# Altium footprint library devices.PCBLIB: 335 footprints (part 17 of 21)
Each footprint in its own frame and in the unit in brackets; x right, y up, seen from the top. Pads: shape width x height; smd on the part's side, far side on the other; paste and mask are expansions set on the pad; w line width, h text height; cw(c..) or ccw(c..) is an arc to the next point about the centre after c.
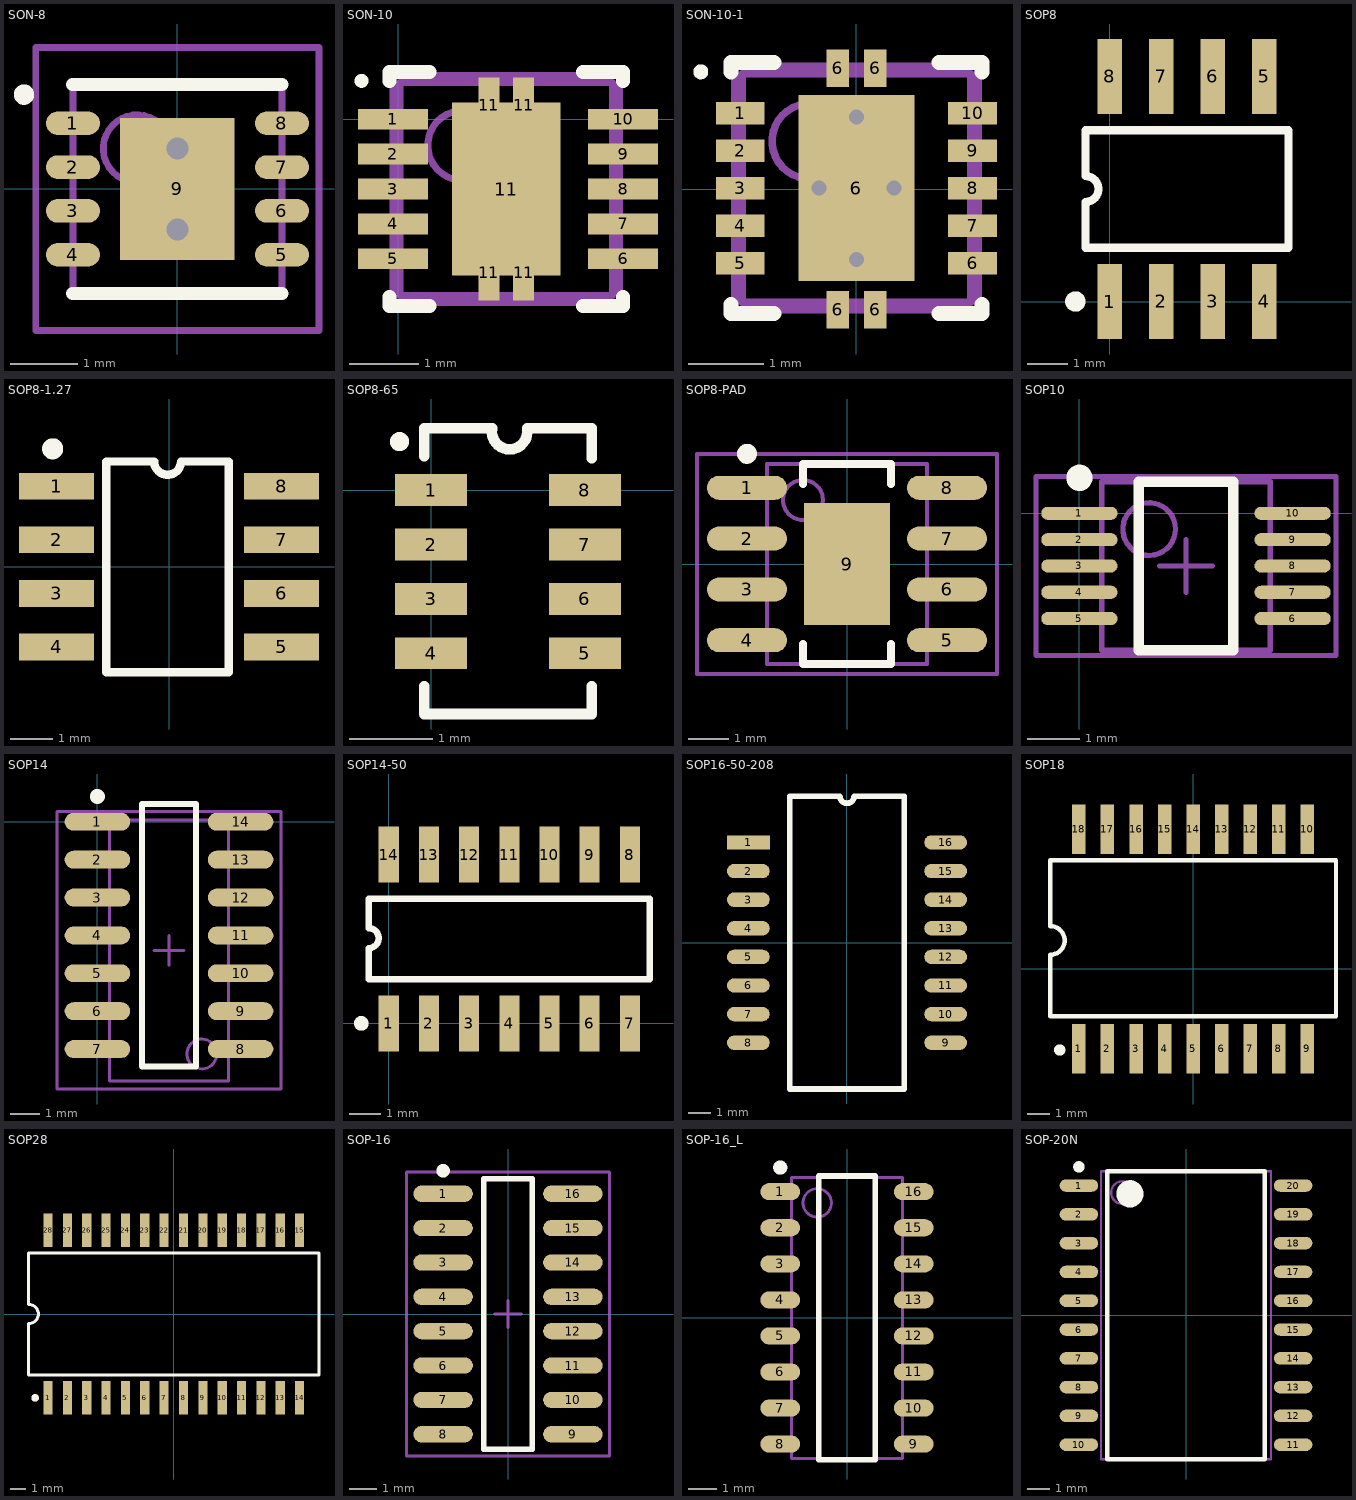
[diagram p16: the footprints below, top view; thin cyan lines are the x and y axes]

## SON-8 [mm] "SON, 8-Leads, Body 3x3 mm, Pitch 0.65mm, IPC Medium Density"
height 0.8
pads (9):
  oval 0.8x0.35 smd: 1(-1.55,0.975) 2(-1.55,0.325) 3(-1.55,-0.325) 4(-1.55,-0.975) 5(1.55,-0.975) 6(1.55,-0.325) 7(1.55,0.325) 8(1.55,0.975)
  rect 1.7x2.1 smd: 9(0,0)
via 0,0.6 diameter 0.66 hole 0.33
via 0,-0.6 diameter 0.66 hole 0.33
Top Overlay:
  circle w0.152: c-2.275,1.4 r0.075
  lines w0.2: -1.55,-1.55 1.55,-1.55 ; -1.55,1.55 1.55,1.55
Mechanical 13:
  circle w0.1: c-0.6,0.6 r0.5
  lines w0.1: -1.55,-1.55 -1.55,1.55 1.55,1.55 1.55,-1.55 -1.55,-1.55
Mechanical 15:
  lines w0.1: -0.5,0 0.5,0 ; 0,-0.5 0,0.5 ; -2.1,-2.1 -2.1,2.1 2.1,2.1 2.1,-2.1 -2.1,-2.1
3D body: height 0.8, standoff 0, extent -1.55,-1.55 1.55,1.55

## SON-10 [mm]
pads (15):
  rect 1x0.3 smd: 1(-0.075,0) 2(-0.075,-0.5) 3(-0.075,-1) 4(-0.075,-1.5) 5(-0.075,-2) 6(3.225,-2) 7(3.225,-1.5) 8(3.225,-1) 9(3.225,-0.5) 10(3.225,0)
  rect 0.3x0.8 smd: 11(1.3,-2.2) 11(1.3,0.2) 11(1.8,-2.2) 11(1.8,0.2)
  rect 1.55x2.48 smd: 11(1.55,-1)
Top Overlay:
  circle w0.1: c-0.525,0.55 r0.05
  lines w0.2: -0.125,-2.55 -0.125,-2.675 0.45,-2.675 ; -0.125,0.55 -0.125,0.675 0.45,0.675 ; 2.65,-2.675 3.225,-2.675 3.225,-2.55 ; 2.65,0.675 3.225,0.675 3.225,0.55
Mechanical 13:
  circle w0.1: c0.925,-0.375 r0.5
  lines w0.1: 0.025,-2.525 0.025,0.525 3.075,0.525 3.075,-2.525 0.025,-2.525
Mechanical 15:
  lines w0.1: 1.05,-1 2.05,-1 ; 1.55,-1.5 1.55,-0.5 ; -0.075,-2.625 3.175,-2.625 3.175,0.625 -0.075,0.625 -0.075,-2.625
3D body: height 1, standoff 0, extent 0.026,-2.524 3.074,0.524

## SON-10-1 [mm]
pads (15):
  rect 0.65x0.3 smd: 1(-1.55,1.013) 2(-1.55,0.513) 3(-1.55,0.013) 4(-1.55,-0.487) 5(-1.55,-0.987) 6(1.55,-0.987) 7(1.55,-0.487) 8(1.55,0.013) 9(1.55,0.513) 10(1.55,1.013)
  rect 0.3x0.5 smd: 6(-0.25,-1.612) 6(-0.25,1.613) 6(0.25,-1.612) 6(0.25,1.613)
  rect 1.55x2.48 smd: 6(0,0.013)
via 0,-0.937 diameter 0.5 hole 0.2
via 0,0.963 diameter 0.5 hole 0.2
via 0.5,0.013 diameter 0.5 hole 0.2
via -0.5,0.013 diameter 0.5 hole 0.2
Top Overlay:
  circle w0.1: c-2.075,1.563 r0.05
  lines w0.2: -1.675,-1.537 -1.675,-1.662 -1.1,-1.662 ; -1.675,1.563 -1.675,1.688 -1.1,1.688 ; 1.1,-1.662 1.675,-1.662 1.675,-1.537 ; 1.1,1.688 1.675,1.688 1.675,1.563
Mechanical 13:
  circle w0.1: c-0.625,0.638 r0.5
  lines w0.1: -1.525,-1.512 1.525,-1.512 1.525,1.538 -1.525,1.538 -1.525,-1.512
Mechanical 15:
  lines w0.1: -0.5,0.013 0.5,0.013 ; 0,-0.487 0,0.513 ; -1.625,-1.612 -1.625,1.638 1.625,1.638 1.625,-1.612 -1.625,-1.612
3D body: height 1, standoff 0, extent -1.524,-1.512 1.524,1.537

## SOP8 [mm] "Small Outline; 8 Leads; Body Width 3.9 mm; Pitch 1.27 mm"
height 1.75
pads (8):
  rect 0.6x1.85 smd: 1(0,0) 2(1.27,0) 3(2.54,0) 4(3.81,0) 5(3.81,5.55) 6(2.54,5.55) 7(1.27,5.55) 8(0,5.55)
Top Overlay:
  circle w0.25: c-0.85,0 r0.125
  lines w0.2: -0.595,1.325 4.405,1.325 4.405,4.225 -0.595,4.225 -0.595,3.093 cw(c-0.595,2.775) -0.595,2.458 -0.595,1.325

## SOP8-1.27 [mil]
pads (8):
  rect 70x25 smd: 1(-105,75) 2(-105,25) 3(-105,-25) 4(-105,-75) 5(105,-75) 6(105,-25) 7(105,25) 8(105,75)
Top Overlay:
  circle w9.84: c-108.58,109.92 r4.92
  lines w7.87: -58.39,-98.74 -58.39,98.11 -13.8,98.11 ccw(c-1.3,98.11) 11.2,98.11 55.79,98.11 55.79,-98.74 -58.39,-98.74

## SOP8-65 [mil]
pads (8):
  rect 34x15 smd: 1(0,0) 2(0,-25.59) 3(0,-51.19) 4(0,-76.78) 5(72.44,-76.78) 6(72.44,-51.19) 7(72.44,-25.59) 8(72.44,0)
Top Overlay:
  circle w7: c-14.86,22.85 r0.98
  lines w5: -3.28,-92.39 -3.28,-105.39 75.72,-105.39 75.72,-92.39 ; -3.28,16.11 -3.28,29.11 28.72,29.11 ; 28.72,28.61 ccw(c36.97,27.54) 45.22,28.61 ; 45.22,29.11 75.72,29.11 75.72,15.11

## SOP8-PAD [mm] "8-Pin Small Outline Integrated Circuit 1.27 mm Pitch, IPC Medium Density"
height 1.55
pads (9):
  oval 2x0.6 smd: 1(-2.5,1.905) 2(-2.5,0.635) 3(-2.5,-0.635) 4(-2.5,-1.905) 5(2.5,-1.905) 6(2.5,-0.635) 7(2.5,0.635) 8(2.5,1.905)
  rect 2.15x3.05 smd: 9(0,0)
Top Overlay:
  circle w0.25: c-2.5,2.755 r0.125
  lines w0.2: -1.1,-2 -1.1,-2.5 1.1,-2.5 1.1,-2 ; -1.1,2 -1.1,2.5 1.1,2.5 1.1,2
Mechanical 13:
  circle w0.1: c-1.1,1.6 r0.5
  lines w0.1: -2,-2.5 -2,2.5 2,2.5 2,-2.5 -2,-2.5
Mechanical 15:
  lines w0.1: -0.5,0 0.5,0 ; 0,-0.5 0,0.5 ; -3.75,-2.75 -3.75,2.75 3.75,2.75 3.75,-2.75 -3.75,-2.75
3D body: height 1.55, standoff 0, extent -2,-2.5 2,2.5

## SOP10 [mm]
pads (10):
  oval 1.45x0.25 smd: 1(0,0) 2(0,-0.5) 3(0,-1) 4(0,-1.5) 5(0,-2) 6(4.05,-2) 7(4.05,-1.5) 8(4.05,-1) 9(4.05,-0.5) 10(4.05,0)
Top Overlay:
  circle w0.25: c0,0.675 r0.125
  lines w0.2: 1.125,-2.6 1.125,0.6 2.925,0.6 2.925,-2.6 1.125,-2.6
Mechanical 13:
  circle w0.1: c1.325,-0.3 r0.5
  lines w0.1: 0.425,-2.6 0.425,0.6 3.625,0.6 3.625,-2.6 0.425,-2.6
Mechanical 15:
  lines w0.1: 1.525,-1 2.525,-1 ; 2.025,-1.5 2.025,-0.5 ; -0.825,-2.7 -0.825,0.7 4.875,0.7 4.875,-2.7 -0.825,-2.7
3D body: height 1.09, standoff 0, extent 0.425,-2.6 3.625,0.6

## SOP14 [mm]
pads (14):
  oval 2.2x0.6 smd: 1(0,0) 2(0,-1.27) 3(0,-2.54) 4(0,-3.81) 5(0,-5.08) 6(0,-6.35) 7(0,-7.62) 8(4.8,-7.62) 9(4.8,-6.35) 10(4.8,-5.08) 11(4.8,-3.81) 12(4.8,-2.54) 13(4.8,-1.27) 14(4.8,0)
Top Overlay:
  circle w0.25: c0,0.85 r0.125
  lines w0.2: 1.5,-8.21 1.5,0.59 3.3,0.59 3.3,-8.21 1.5,-8.21
Mechanical 13:
  circle w0.1: c3.5,-7.785 r0.5
  lines w0.1: 0.4,-8.685 0.4,0.065 4.4,0.065 4.4,-8.685 0.4,-8.685
Mechanical 15:
  lines w0.1: 1.9,-4.31 2.9,-4.31 ; 2.4,-4.81 2.4,-3.81 ; -1.35,-8.96 -1.35,0.34 6.15,0.34 6.15,-8.96 -1.35,-8.96
3D body: height 1.75, standoff 0, extent 0.4,-8.685 4.4,0.065

## SOP14-50 [mil]
pads (14):
  rect 25x70 smd: 1(0,0) 2(50,0) 3(100,0) 4(150,0) 5(200,0) 6(250,0) 7(300,0) 8(300,210) 9(250,210) 10(200,210) 11(150,210) 12(100,210) 13(50,210) 14(0,210)
Top Overlay:
  circle w10: c-34.12,0 r4.12
  lines w8: -25,55 325,55 325,155 -25,155 -25,118.62 cw(c-25,106.12) -25,93.62 -25,55

## SOP16-50-208 [mil]
pads (16):
  rect 75x25 smd: 1(-172.5,175)
  oval 75x25 smd: 2(-172.5,125) 3(-172.5,75) 4(-172.5,25) 5(-172.5,-25) 6(-172.5,-75) 7(-172.5,-125) 8(-172.5,-175) 9(172.5,-175) 10(172.5,-125) 11(172.5,-75) 12(172.5,-25) 13(172.5,25) 14(172.5,75) 15(172.5,125) 16(172.5,175)
Top Overlay:
  lines w10: -100,-255.91 -100,255.91 -68.41,255.91 -12.5,255.91 ccw(c0,255.91) 12.5,255.91 68.41,255.91 100,255.91 100,-255.91 -100,-255.91

## SOP18 [mm] "Small Outline; 18 Leads; Body Width 5.6 mm; Pitch 1.27 mm"
height 2
pads (18):
  rect 0.6x2.2 smd: 1(-5.08,-3.556) 2(-3.81,-3.556) 3(-2.54,-3.556) 4(-1.27,-3.556) 5(0,-3.556) 6(1.27,-3.556) 7(2.54,-3.556) 8(3.81,-3.556) 9(5.08,-3.556) 10(5.08,6.223) 11(3.81,6.223) 12(2.54,6.223) 13(1.27,6.223) 14(0,6.223) 15(-1.27,6.223) 16(-2.54,6.223) 17(-3.81,6.223) 18(-5.08,6.223)
Top Overlay:
  circle w0.25: c-5.93,-3.6 r0.125
  lines w0.2: -6.35,-2.1 -6.35,0.633 ccw(c-6.35,1.269) -6.35,1.905 -6.35,4.826 6.35,4.826 6.35,-2.1 -6.35,-2.1

## SOP28 [mm] "Small Outline; 28 Leads; Body Width 9.1 mm; Pitch 1.27 mm"
height 3
pads (28):
  rect 0.6x2.2 smd: 1(-8.255,-5.5) 2(-6.985,-5.5) 3(-5.715,-5.5) 4(-4.445,-5.5) 5(-3.175,-5.5) 6(-1.905,-5.5) 7(-0.635,-5.5) 8(0.635,-5.5) 9(1.905,-5.5) 10(3.175,-5.5) 11(4.445,-5.5) 12(5.715,-5.5) 13(6.985,-5.5) 14(8.255,-5.5) 15(8.255,5.5) 16(6.985,5.5) 17(5.715,5.5) 18(4.445,5.5) 19(3.175,5.5) 20(1.905,5.5) 21(0.635,5.5) 22(-0.635,5.5) 23(-1.905,5.5) 24(-3.175,5.5) 25(-4.445,5.5) 26(-5.715,5.5) 27(-6.985,5.5) 28(-8.255,5.5)
Top Overlay:
  circle w0.25: c-9.105,-5.5 r0.125
  lines w0.2: -9.525,-4 9.525,-4 9.525,4 -9.525,4 -9.525,0.635 cw(c-9.525,0) -9.525,-0.635 -9.525,-4

## SOP-16 [mm]
pads (16):
  oval 2.2x0.6 smd: 1(-2.4,4.445) 2(-2.4,3.175) 3(-2.4,1.905) 4(-2.4,0.635) 5(-2.4,-0.635) 6(-2.4,-1.905) 7(-2.4,-3.175) 8(-2.4,-4.445) 9(2.4,-4.445) 10(2.4,-3.175) 11(2.4,-1.905) 12(2.4,-0.635) 13(2.4,0.635) 14(2.4,1.905) 15(2.4,3.175) 16(2.4,4.445)
Top Overlay:
  circle w0.25: c-2.4,5.295 r0.125
  lines w0.2: -0.9,-5 -0.9,5 0.9,5 0.9,-5 -0.9,-5
Mechanical 15:
  lines w0.1: -0.5,0 0.5,0 ; 0,-0.5 0,0.5 ; -3.75,-5.25 -3.75,5.25 3.75,5.25 3.75,-5.25 -3.75,-5.25

## SOP-16_L [mm] "16-Pin Small Outline Integrated Circuit 1.27 mm Pitch, IPC High Density"
height 1.5
pads (16):
  oval 1.4x0.6 smd: 1(-2.35,4.445) 2(-2.35,3.175) 3(-2.35,1.905) 4(-2.35,0.635) 5(-2.35,-0.635) 6(-2.35,-1.905) 7(-2.35,-3.175) 8(-2.35,-4.445) 9(2.35,-4.445) 10(2.35,-3.175) 11(2.35,-1.905) 12(2.35,-0.635) 13(2.35,0.635) 14(2.35,1.905) 15(2.35,3.175) 16(2.35,4.445)
Top Overlay:
  circle w0.25: c-2.35,5.295 r0.125
  lines w0.2: -1,-5 -1,5 1,5 1,-5 -1,-5
Mechanical 13:
  circle w0.1: c-1.05,4.05 r0.5
  lines w0.1: -1.95,-4.95 -1.95,4.95 1.95,4.95 1.95,-4.95 -1.95,-4.95
3D body: height 1.5, standoff 0, extent -1.95,-4.95 1.95,4.95

## SOP-20N [mm] "SOP, 20-Leads, Body 12.7x7.5mm (max), Pitch 1.27mm, IPC Medium Density"
height 2.565
pads (20):
  oval 1.7x0.55 smd: 1(-4.725,5.715) 2(-4.725,4.445) 3(-4.725,3.175) 4(-4.725,1.905) 5(-4.725,0.635) 6(-4.725,-0.635) 7(-4.725,-1.905) 8(-4.725,-3.175) 9(-4.725,-4.445) 10(-4.725,-5.715) 11(4.725,-5.715) 12(4.725,-4.445) 13(4.725,-3.175) 14(4.725,-1.905) 15(4.725,-0.635) 16(4.725,0.635) 17(4.725,1.905) 18(4.725,3.175) 19(4.725,4.445) 20(4.725,5.715)
Top Overlay:
  circle w0.6: c-2.475,5.35 r0.3
  circle w0.25: c-4.725,6.54 r0.125
  lines w0.2: -3.475,-6.35 3.475,-6.35 3.475,6.35 -3.475,6.35 -3.475,-6.35
Mechanical 13:
  circle w0.1: c-2.8,5.4 r0.5
  lines w0.1: -3.75,-6.35 3.75,-6.35 3.75,6.35 -3.75,6.35 -3.75,-6.35
3D body: height 2.57, standoff 0.1, extent -3.75,-6.35 3.75,6.35